# Altium footprint library Cty1.PcbLib: 1378 footprints (part 51 of 87)
Each footprint in its own frame and in the unit in brackets; x right, y up, seen from the top. Pads: shape width x height; smd on the part's side, far side on the other; paste and mask are expansions set on the pad; w line width, h text height; cw(c..) or ccw(c..) is an arc to the next point about the centre after c.
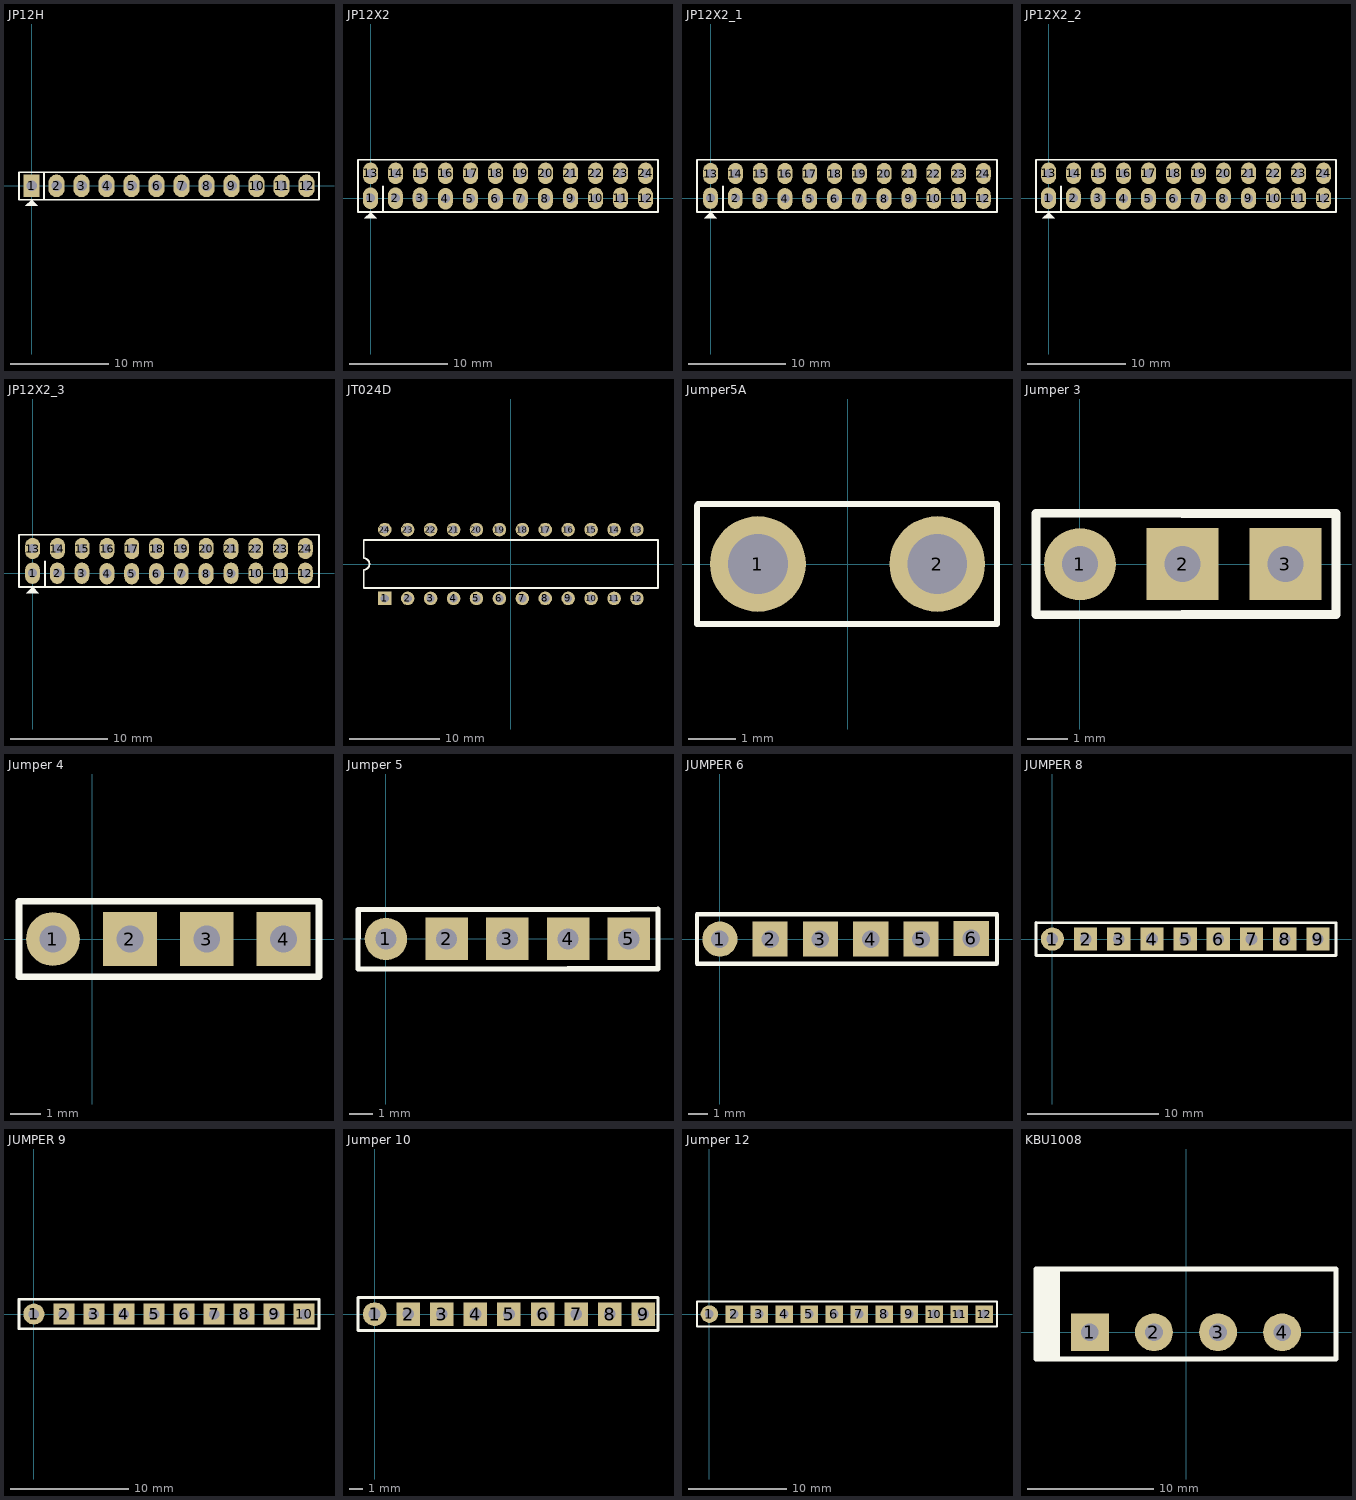
[diagram p50: the footprints below, top view; thin cyan lines are the x and y axes]

## JP12H [mil] "JP12"
height 200
pads (12):
  rect 65x90 hole 42: 1(0,0)
  oval 65x90 hole 42: 2(100,0) 3(200,0) 4(300,0) 5(400,0) 6(500,0) 7(600,0) 8(700,0) 9(800,0) 10(900,0) 11(1000,0) 12(1100,0)
Top Overlay:
  region: 0,-55 -25,-80 25,-80
  lines w7: 50,-55 50,55 ; -50,-55 1150,-55 1150,55 -50,55 -50,-55
3D body "pin_header_aw140-ea-g12g.stp": height 108.27, standoff -84.65, extent -45.28,-12.8 1146.85,425.79

## JP12X2 [mil]
pads (24):
  oval 60x86 hole 36: 1(-0.5,0.5) 2(99.5,0.5) 3(198.5,0.5) 4(299.5,-1.5) 5(399.5,-1.5) 6(499.5,-1.5) 7(599.5,-1.5) 8(699.5,-1.5) 9(800,0) 10(900,0) 11(1000,0) 12(1100,0) 13(0,100) 14(100,100) 15(200,100) 16(300,100) 17(400,100) 18(500,100) 19(600,100) 20(700,100) 21(800,100) 22(900,100) 23(1000,100) 24(1100,100)
Top Overlay:
  region: 0,-55 -25,-80 25,-80
  lines w7: 50,-55 50,49 ; -50.5,-55 1149.61,-55 1149.61,155 -50.5,155 -50.5,50.5 -50.5,-55
3D body "pin_header_awl254-dg-g24d.stp": height 366.14, standoff -86.61, extent -49.21,-48.43 1150.79,151.57

## JP12X2_1 [mil]
pads (24):
  oval 60x86 hole 36: 1(-0.5,0.5) 2(99.5,0.5) 3(198.5,0.5) 4(299.5,-1.5) 5(399.5,-1.5) 6(499.5,-1.5) 7(599.5,-1.5) 8(699.5,-1.5) 9(800,0) 10(900,0) 11(1000,0) 12(1100,0) 13(0,100) 14(100,100) 15(200,100) 16(300,100) 17(400,100) 18(500,100) 19(600,100) 20(700,100) 21(800,100) 22(900,100) 23(1000,100) 24(1100,100)
Top Overlay:
  region: 0,-55 -25,-80 25,-80
  lines w7: 50,-55 50,49 ; -55,-55 1155,-55 1155,155 -55,155 -55,46 -55,-55
3D body "female_header_a-bl254-dg-g24d.stp": height 366.14, standoff -94.49, extent -55.12,-47.24 1154.73,149.61

## JP12X2_2 [mil]
pads (24):
  oval 60x86 hole 36: 1(-0.5,0.5) 2(99.5,0.5) 3(198.5,0.5) 4(299.5,-1.5) 5(399.5,-1.5) 6(499.5,-1.5) 7(599.5,-1.5) 8(699.5,-1.5) 9(800,0) 10(900,0) 11(1000,0) 12(1100,0) 13(0,100) 14(100,100) 15(200,100) 16(300,100) 17(400,100) 18(500,100) 19(600,100) 20(700,100) 21(800,100) 22(900,100) 23(1000,100) 24(1100,100)
Top Overlay:
  region: 0,-55 -25,-80 25,-80
  lines w7: 50,-55 50,49 ; -50.5,-55 1149.61,-55 1149.61,155 -50.5,155 -50.5,50.5 -50.5,-55
3D body "pin_header_awl254-da-g24d.stp": height 216.54, standoff -98.43, extent -50.2,-12.8 1149.8,494.29

## JP12X2_3 [mil]
pads (24):
  oval 60x86 hole 36: 1(-0.5,0.5) 2(99.5,0.5) 3(198.5,0.5) 4(299.5,-1.5) 5(399.5,-1.5) 6(499.5,-1.5) 7(599.5,-1.5) 8(699.5,-1.5) 9(800,0) 10(900,0) 11(1000,0) 12(1100,0) 13(0,100) 14(100,100) 15(200,100) 16(300,100) 17(400,100) 18(500,100) 19(600,100) 20(700,100) 21(800,100) 22(900,100) 23(1000,100) 24(1100,100)
Top Overlay:
  region: 0,-55 -25,-80 25,-80
  lines w7: 50,-55 50,49 ; -55,-55 1155,-55 1155,155 -55,155 -55,46 -55,-55
3D body "female_header_a-bl254-da-g24d.stp": height 216.54, standoff -106.3, extent -54.13,-6.89 1155.71,489.17

## JT024D [mm] "DIP; 24 Leads; Row Spacing 7.62 mm; Pitch 2.54 mm"
height 5.08
pads (24):
  rect 1.5x1.5 hole 0.9: 1(-13.97,-3.81)
  round 1.5 hole 0.9: 2(-11.43,-3.81) 3(-8.89,-3.81) 4(-6.35,-3.81) 5(-3.81,-3.81) 6(-1.27,-3.81) 7(1.27,-3.81) 8(3.81,-3.81) 9(6.35,-3.81) 10(8.89,-3.81) 11(11.43,-3.81) 12(13.97,-3.81) 13(13.97,3.81) 14(11.43,3.81) 15(8.89,3.81) 16(6.35,3.81) 17(3.81,3.81) 18(1.27,3.81) 19(-1.27,3.81) 20(-3.81,3.81) 21(-6.35,3.81) 22(-8.89,3.81) 23(-11.43,3.81) 24(-13.97,3.81)
Top Overlay:
  lines w0.2: -16.3,-2.65 -16.3,-0.635 ccw(c-16.3,0) -16.3,0.635 -16.3,2.65 16.3,2.65 16.3,-2.65 -16.3,-2.65

## Jumper5A [mil] "JacPower"
pads (2):
  round 80 hole 50: 1(-75,0) 2(75,0)
Top Overlay:
  lines w5: -125.98,-50 -75,-50 125,-50 125,50 -125,50 -125.98,49.02 -125.98,-50

## Jumper 3 [mil]
pads (3):
  round 70 hole 35 unplated: 1(0,0)
  rect 70x70 hole 35 unplated: 2(100,0) 3(200,0)
Top Overlay:
  lines w8.66: -42.75,-49.25 -42.75,49.5 100,49.21 200,49.21 249.21,49.21 249.21,-49.21 200,-49.21 100,-49.21 -42.75,-49.25

## Jumper 4 [mil]
pads (4):
  round 70 hole 35 unplated: 1(-51,0)
  rect 70x70 hole 35 unplated: 2(49,0) 3(149,0) 4(249,0)
Top Overlay:
  lines w8.66: -95.16,-48.96 -95.16,49.21 295,49.21 295,-49.21 -94.91,-49.21

## Jumper 5 [mil]
pads (5):
  round 70 hole 35 unplated: 1(0,0)
  rect 70x70 hole 35 unplated: 2(100,0) 3(200,0) 4(300,0) 5(400,0)
Top Overlay:
  lines w8.66: -46,-49.25 300,-49.21 400,-49.21 448.21,-49.21 448.21,49.21 400,48.46 300,48.46 -45.5,48.75 -46,-49.25

## JUMPER 6 [mil]
pads (6):
  round 70 hole 35 unplated: 1(0,0)
  rect 70x70 hole 35 unplated: 2(100,0) 3(200,0) 4(300,0) 5(400,0) 6(500,1.25)
Top Overlay:
  lines w8.66: -45.5,-48.75 550.75,-48.75 551.21,-48.29 551.21,49.21 -45.5,49.21 -45.5,-48.75

## JUMPER 8 [mil]
pads (9):
  round 70 hole 35 unplated: 1(0,0)
  rect 70x70 hole 35 unplated: 2(100,0) 3(200,0) 4(300,0) 5(400,0) 6(500,0) 7(600,0) 8(700,0) 9(800,0)
Top Overlay:
  lines w8.66: -49.5,-49.25 800,-49.21 854.5,-49.21 854.5,49.21 800,49.21 -49.5,49.5 -49.5,-49.25

## JUMPER 9 [mil]
pads (10):
  round 70 hole 35 unplated: 1(0,0)
  rect 70x70 hole 35 unplated: 2(100,0) 3(200,0) 4(300,0) 5(400,0) 6(500,0) 7(600,0) 8(700,0) 9(800,0) 10(900,0)
Top Overlay:
  lines w8.66: -49.5,-49.25 800,-49.21 900,-49.21 949.21,-49.21 949.21,49.21 900,49.21 800,49.21 -49.5,49.5 -49.5,-49.25

## Jumper 10 [mil]
pads (9):
  round 70 hole 35 unplated: 1(0,0)
  rect 70x70 hole 35 unplated: 2(100,0) 3(200,0) 4(300,0) 5(400,0) 6(500,0) 7(600,0) 8(700,0) 9(800,0)
Top Overlay:
  lines w8.66: 843.5,-49.25 -49.5,-49.25 -49.5,49.5 843.75,50 ; 843.71,-49.21 843.71,49.21

## Jumper 12 [mil]
pads (12):
  round 70 hole 35 unplated: 1(0,0)
  rect 70x70 hole 35 unplated: 2(100,0) 3(200,0) 4(300,0) 5(400,0) 6(500,0) 7(600,0) 8(700,0) 9(800,0) 10(900,0) 11(1000,0) 12(1100,0)
Top Overlay:
  lines w8.66: -49.5,-49.25 -49.5,49.5 1151.5,50.17 1151.5,-49.25 -49.5,-49.25

## KBU1008 [mm] "Diode bridge"
height 7.62
pads (4):
  rect 3x3 hole 1.4: 1(-7.62,0)
  round 3 hole 1.4: 2(-2.54,0) 3(2.54,0) 4(7.62,0)
Top Overlay:
  rectangle: -11.887,-2.108 -10.16,5.004
  lines w0.381: -10.16,-2.108 -10.16,5.004 ; -11.887,-2.108 11.887,-2.108 11.887,5.004 -11.887,5.004 -11.887,-2.108